# Altium footprint library Wireless Security Board.PcbLib: 38 footprints (part 1 of 3)
Each footprint in its own frame and in the unit in brackets; x right, y up, seen from the top. Pads: shape width x height; smd on the part's side, far side on the other; paste and mask are expansions set on the pad; w line width, h text height; cw(c..) or ccw(c..) is an arc to the next point about the centre after c.
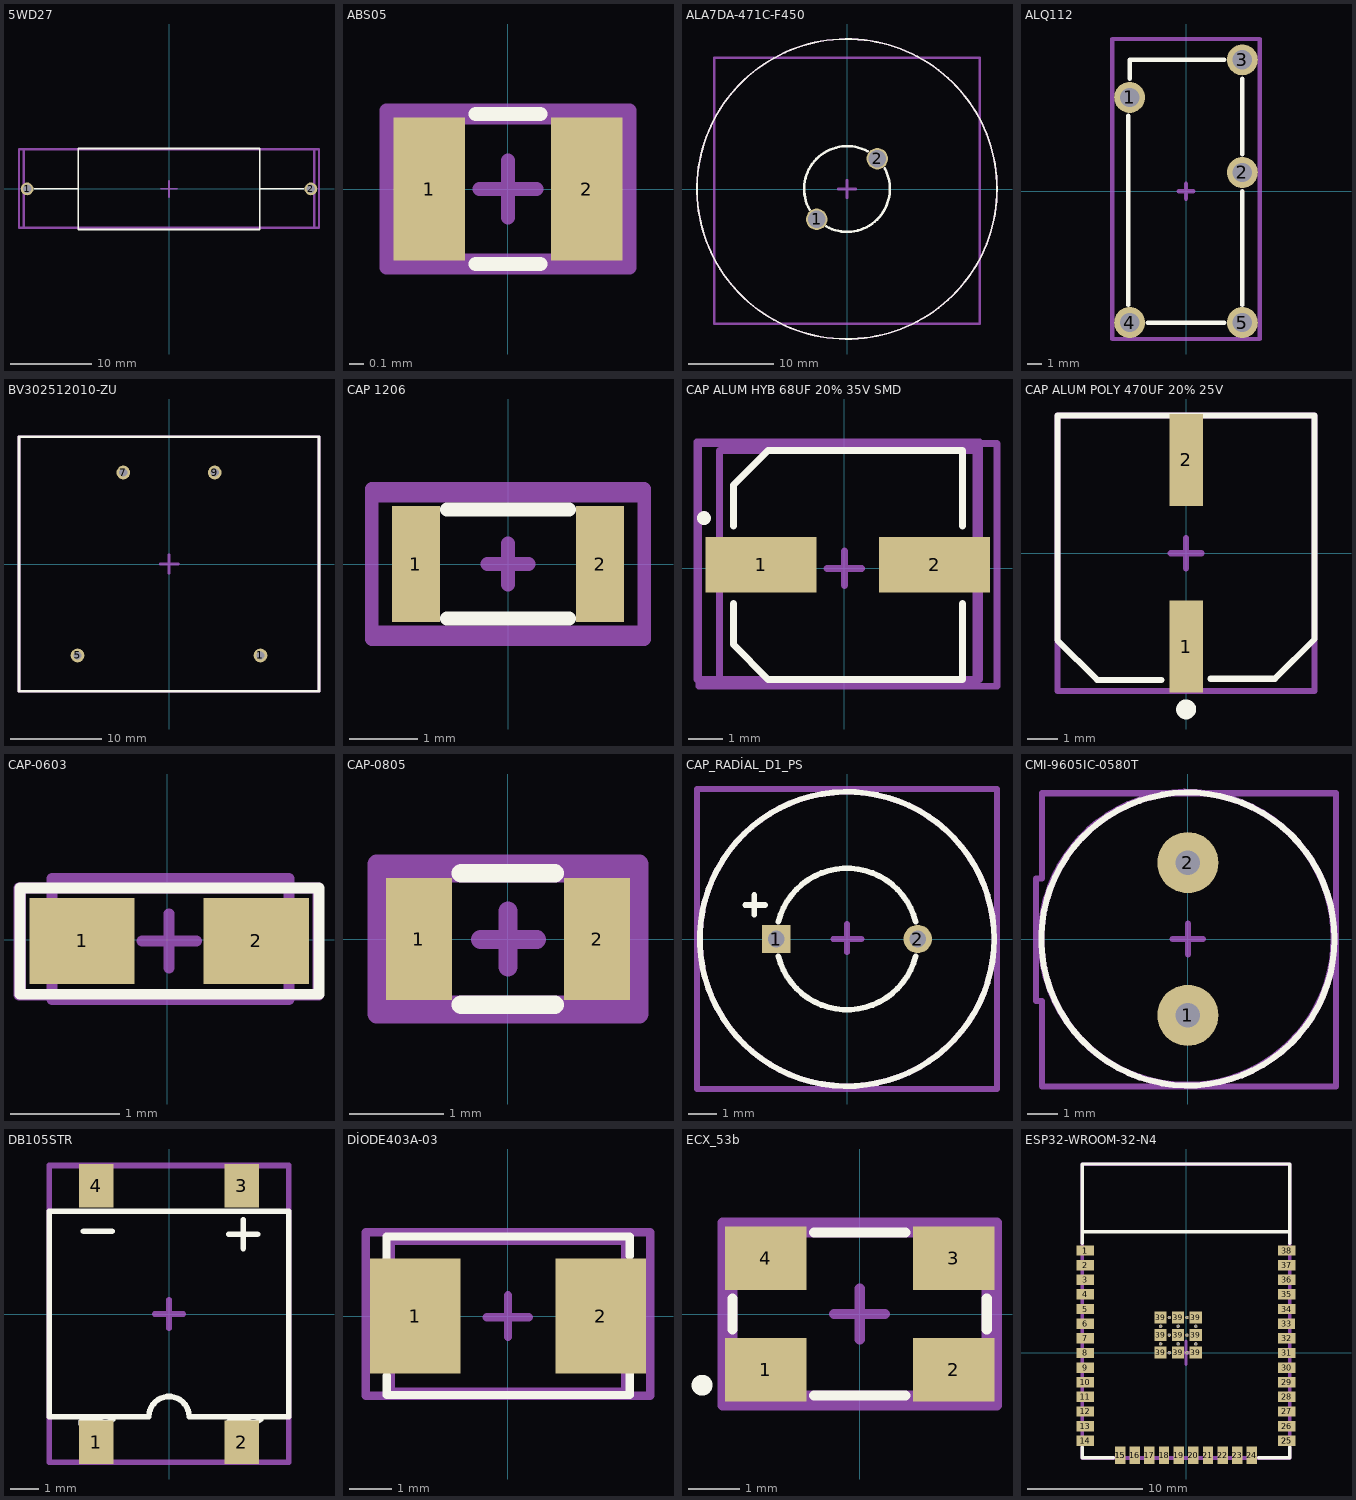
[diagram p0: the footprints below, top view; thin cyan lines are the x and y axes]

## 5WD27 [mm]
pads (2):
  round 1.575 hole 1.05: 1(-17.5,0) 2(17.5,0)
Top Overlay:
  lines w0.2: -16.6,0 -11.211,0 ; 11.211,0 16.6,0 ; -11.2,-5 -11.2,4.978 11.2,4.978 11.2,-5 -11.2,-5
Top 3D Body:
  lines w0.3: -17.9,-4.8 17.9,-4.8 17.9,4.9 -17.9,4.9 -17.9,-4.8
Top Component Center:
  lines w0.2: -1,0 1,0 ; 0,-1 0,1
  lines w0.3: -18.5,-4.8 18.5,-4.8 18.5,4.9 -18.5,4.9 -18.5,-4.8
Top Designator:
  lines w0.3: -18.5,-4.8 -18.5,4.9 18.5,4.9 18.5,-4.8 -18.5,-4.8
  text ".Designator" at -11.55,-0.917 h2.5
3D body "5WD27.step": height 9.66, standoff -6.16, extent -17.9,-4.825 17.9,4.825

## ABS05 [mm]
pads (2):
  rect 0.5x1 smd mask+0.05: 1(-0.55,0) 2(0.55,0)
Top Overlay:
  lines w0.1: -0.225,-0.525 0.225,-0.525 ; -0.225,0.525 0.225,0.525
Top 3D Body:
  lines w0.1: -0.8,-0.5 -0.8,0.5 0.8,0.5 0.8,-0.5 -0.8,-0.5
Top Component Center:
  lines w0.1: -0.2,0 0.2,0 ; 0,-0.2 0,0.2 ; -0.85,-0.55 -0.85,0.55 0.85,0.55 0.85,-0.55 -0.85,-0.55
Top Designator:
  lines w0.1: -0.85,-0.55 0.85,-0.55 0.85,0.55 -0.85,0.55 -0.85,-0.55
  text ".Designator" at -0.72,-0.145 h0.3
3D body "ABS05-32.768KHZ-T.step": height 0.5, standoff 0, extent -0.8,-0.5 0.8,0.5

## ALA7DA-471C-F450 [mm] "CAP-ALUM-470UF-450V-%20"
pads (2):
  round 2.5 hole 2 mask+0.05: 1(-3.536,-3.536) 2(3.536,3.536)
Top Overlay:
  circle w0.2: c0,0 r17.5
  lines w0.3: -4.367,-2.435 cw(c0,0) 2.388,4.393 ; -2.435,-4.367 ccw(c0,0) 4.393,2.388
Top 3D Body:
  lines w0.3: -15.5,-15.7 15.5,-15.7 15.5,15.3 -15.5,15.3 -15.5,-15.7
Top Component Center:
  circle w0.2: c0,0 r17.5
  lines w0.3: -1,0 1,0 ; 0,-1 0,1
Top Designator:
  circle w0.2: c0,0 r17.5
  text ".Designator" at -7.05,-0.417 h2.5
3D body "ala7da471cf450.stp": height 53.5, standoff -5.79, extent -15.5,-15.7 15.5,15.3

## ALQ112 [mm]
pads (5):
  round 2.1 hole 1.3 mask+0.05: 1(-3.81,6.35) 2(3.81,1.27) 3(3.81,8.89) 4(-3.81,-8.89) 5(3.81,-8.89)
Top Overlay:
  lines w0.3: -3.9,-7.7 -3.9,5.1 ; -3.8,7.6 -3.8,8.9 2.6,8.9 ; -2.6,-8.9 2.6,-8.9 ; 3.8,-7.7 3.8,0 ; 3.8,2.5 3.8,7.6
Top 3D Body:
  lines w0.3: -5,-10 -5,10.3 5,10.3 5,-10 -5,-10
Top Component Center:
  lines w0.3: -0.5,0 0.5,0 ; 0,-0.5 0,0.5 ; -5,-10 -5,10.3 5,10.3 5,-10 -5,-10
Top Designator:
  lines w0.3: -5,-10 -5,10.3 5,10.3 5,-10 -5,-10
  text ".Designator" at 0.917,9.05 h2.5
3D body: height 0, standoff -3.8, extent -4.11,6.05 -3.51,6.65
3D body: height 0, standoff -3.8, extent -4.11,-9.19 -3.51,-8.59
3D body: height 0, standoff -3.8, extent 3.51,8.59 4.11,9.19
3D body: height 0, standoff -3.8, extent 3.51,0.97 4.11,1.57
3D body: height 0, standoff -3.8, extent 3.51,-9.19 4.11,-8.59
3D body: height 16, standoff 0, extent -5,-10 5,10.27

## BV302512010-ZU [mm]
pads (4):
  round 1.5 hole 0.9 mask+0.05: 1(10,-10) 5(-10,-10) 7(-5,10) 9(5,10)
Top Overlay:
  lines w0.3: -16.4,-13.9 -16.4,13.9 16.4,13.9 16.4,-13.9 -16.4,-13.9
Top 3D Body:
  lines w0.3: -16.4,-13.9 -16.4,13.9 16.4,13.9 16.4,-13.9 -16.4,-13.9
Top Component Center:
  lines w0.3: -0.96,-0.004 1.04,-0.004 ; 0,-1 0,1 ; -16.4,-13.9 16.4,-13.9 16.4,13.9 -16.4,13.9 -16.4,-13.9
Top Designator:
  lines w0.3: -16.4,-13.9 -16.4,13.9 16.4,13.9 16.4,-13.9 -16.4,-13.9
  text ".Designator" at -7.8,-0.667 h2.5
3D body "ZETTLER BV301 BV302 1.0VA v2.iges": height 22.9, standoff -4.9, extent -16.4,-13.9 16.4,13.9

## CAP 1206 [mm]
pads (2):
  rect 0.7x1.7 smd mask+0.05: 1(-1.35,0) 2(1.35,0)
Top Overlay:
  lines w0.2: -0.9,-0.8 0.9,-0.8 ; -0.9,0.8 0.9,0.8
Top 3D Body:
  lines w0.2: -2,-1 2,-1 2,1 -2,1 -2,-1
Top Component Center:
  lines w0.2: -0.3,0 0.3,0 ; 0,-0.3 0,0.3 ; -2,-1.1 2,-1.1 2,1.1 -2,1.1 -2,-1.1
Top Designator:
  lines w0.2: -2,-1.1 -2,1.1 2,1.1 2,-1.1 -2,-1.1
  text ".Designator" at -1.3,-0.267 h0.7
3D body "CAPC1206.STEP": height 1.3, standoff -0.01, extent -1.975,-0.976 1.975,0.976

## CAP ALUM HYB 68UF 20% 35V SMD [mm] "EEH-ZA1V680XP"
pads (2):
  rect 3.2x1.6 smd: 1(-2.4,0.1) 2(2.6,0.1)
Top Overlay:
  circle w0.2: c-4.05,1.45 r0.1
  lines w0.2: -3.2,-1.02 -3.2,-2.2 -2.2,-3.2 3.4,-3.2 3.4,-1.02 ; -3.2,1.22 -3.2,2.4 -2.2,3.4 3.4,3.4 3.4,1.22
Top 3D Body:
  circle w0.2: c-4.05,1.45 r0.1
  lines w0.2: -3.6,-3.2 -3.6,3.4 3.8,3.4 3.8,-3.2 -3.6,-3.2
Top Component Center:
  lines w0.2: -0.5,0 0.5,0 ; 0,-0.5 0,0.5 ; -4.2,-3.4 -4.2,3.6 4.4,3.6 4.4,-3.4 -4.2,-3.4
Top Designator:
  lines w0.2: -4.25,-3.2 3.9,-3.2 3.9,3.65 -4.25,3.65 -4.25,1.15 -4.25,-0.95 -4.25,-3.2
  text ".Designator" at -3.9,-0.4 h1.5
3D body "step_temp.STEP": height 7.7, standoff 0, extent -3.55,-3.2 3.75,3.4

## CAP ALUM POLY 470UF 20% 25V [mm] "PCR1E471MCL1GS"
pads (2):
  rect 1.1x3 smd mask+0.05: 1(0,-3.05) 2(0,3.05)
Top Overlay:
  circle w0.35: c0,-5.1 r0.15
  lines w0.2: -0.806,-4.136 -2.906,-4.136 -4.206,-2.836 -4.206,4.5 4.2,4.5 4.2,-2.8 2.9,-4.1 0.8,-4.1
Top 3D Body:
  lines w0.2: -4.2,-4.5 4.2,-4.5 4.2,4.5 -4.2,4.5 -4.2,-4.5
Top Component Center:
  lines w0.2: -0.5,0 0.5,0 ; 0,-0.5 0,0.5 ; -4.2,-4.5 4.2,-4.5 4.2,4.5 -4.2,4.5 -4.2,-4.5
Top Designator:
  lines w0.2: -4.2,-4.5 4.2,-4.5 4.2,4.5 -4.2,4.5 -4.2,-4.5
  text ".Designator" at -3.55,-0.484 h1.7
3D body "PCR1E221MCL6GS.STEP": height 10.8, standoff 0, extent -4.15,-4.45 4.15,4.45

## CAP-0603 [mil]
pads (2):
  rect 38x31 smd mask+1.97: 1(-30.8,-0.5) 2(32.2,-0.5)
Top Overlay:
  lines w3.94: -53.2,-19.8 -53.2,18.7 54.9,18.7 54.9,-19.8 -53.2,-19.8
Top 3D Body:
  lines w3.94: -41.7,-21.7 -41.7,22.1 44,22.1 44,-21.7 -41.7,-21.7
Top Component Center:
  lines w3.94: -9.14,-0.5 10.54,-0.5 ; 0.7,-10.34 0.7,9.34 ; -53,-19.8 -53,18.7 54.5,18.7 54.5,-19.8 -53,-19.8
Top Designator:
  lines w3.94: -53.6,-20 54.8,-20 54.8,18.7 -53.6,18.7 -53.6,-20
  text ".Designator" at -27.06,-7.4 h19.68
3D body "CAPC0603.STEP": height 31.5, standoff 0, extent -39.94,-20.23 42.77,20.27

## CAP-0805 [mm]
pads (2):
  rect 0.7x1.3 smd mask+0.05: 1(-0.95,0) 2(0.95,0)
Top Overlay:
  lines w0.2: -0.5,-0.7 0.5,-0.7 ; -0.5,0.7 0.5,0.7
Top 3D Body:
  lines w0.2: -1.3,-0.7 -1.3,0.7 1.3,0.7 1.3,-0.7 -1.3,-0.7
Top Component Center:
  lines w0.2: -0.293,-0.006 0.307,-0.006 ; 0,-0.3 0,0.3 ; -1.4,-0.8 -1.4,0.8 1.4,0.8 1.4,-0.8 -1.4,-0.8
Top Designator:
  lines w0.2: -1.4,-0.8 -1.4,0.8 1.4,0.8 1.4,-0.8 -1.4,-0.8
  text ".Designator" at -1.1,-0.233 h0.5
3D body "CAPC0805.STEP": height 0.9, standoff 0, extent -1.301,-0.678 1.301,0.678

## CAP_RADİAL_D1_PS [mm]
pads (2):
  rect 1x1 hole 0.6 mask+0.05: 1(-2.5,0)
  round 1 hole 0.6 mask+0.05: 2(2.5,0)
Top Overlay:
  circle w0.2: c0,0 r5.2
  lines w0.2: -3.6,1.2 -2.9,1.2 ; -3.271,0.852 -3.271,1.552 ; -2.425,-0.606 ccw(c0,0) 2.425,-0.606 ; -2.425,0.606 cw(c0,0) 2.425,0.606
Top 3D Body:
  lines w0.2: -5.3,-5.3 5.3,-5.3 5.3,5.3 -5.3,5.3 -5.3,-5.3
Top Component Center:
  circle w0.2: c0,0 r5.2
  lines w0.2: -0.489,0 0.511,0 ; 0,-0.47 0,0.53
Top Designator:
  circle w0.2: c0,0 r5.2
  text ".Designator" at -3.75,-0.25 h1.5
3D body "CAP_ESH_H4_KEM.step": height 22.11, standoff -4.27, extent -5.269,-5.242 5.245,5.242

## CMI-9605IC-0580T [mm] "BUZZER-MAGNETIC-5V"
pads (2):
  round 2 hole 0.8 mask+0.05: 1(0,-2.5) 2(0,2.5)
Top Overlay:
  circle w0.2: c0,0 r4.8
Top 3D Body:
  lines w0.2: -4.975,-2.025 -4.975,1.975 -4.775,1.975 -4.775,4.775 4.85,4.775 4.85,-4.825 -4.775,-4.825 -4.775,-2.025 -4.975,-2.025
Top Component Center:
  circle w0.2: c0,0 r4.8
  lines w0.2: -0.5,0 0.5,0 ; 0,-0.5 0,0.5
Top Designator:
  circle w0.2: c-0.025,0.025 r4.8
  text ".Designator" at -2.121,-0.738 h1.52
3D body: height 5.2, standoff 0.2, extent -4.767,-4.826 4.833,4.774
3D body: height 0.15, standoff -5.35, extent -0.275,2.175 0.325,2.775
3D body: height 0.15, standoff -3.85, extent -0.275,-2.825 0.325,-2.225
3D body: height 5.3, standoff 5.2, extent -3.775,-3.825 3.825,3.775
3D body: height 5.3, standoff 5.2, extent -4.975,-2.025 -0.975,1.975

## DB105STR [mm] "BRIDGE-RECT-DBS-1PHASE-600V-1A"
pads (4):
  rect 1.2x1.52 smd: 1(-2.55,-4.5) 2(2.55,-4.5) 3(2.55,4.5) 4(-2.55,4.5)
Top Overlay:
  lines w0.2: -3,2.9 -2,2.9 ; 2.1,2.8 3.1,2.8 ; 2.6,2.3 2.6,3.3 ; -4.2,-3.6 -0.707,-3.6 cw(c0,-3.6) 0.707,-3.6 4.2,-3.6 4.2,3.6 -4.2,3.6 -4.2,-3.6
  text "~" at -3.4,-4.4 h1.52
  text "~" at 1.8,-4.4 h1.52
Top 3D Body:
  lines w0.2: -4.2,-5.2 4.2,-5.2 4.2,5.2 -4.2,5.2 -4.2,-5.2
Top Component Center:
  lines w0.2: -4.2,5.2 -4.2,-5.2 4.2,-5.2 4.2,5.218 -4.2,5.218 ; -0.5,0 0.5,0 ; 0,-0.5 0,0.5
Top Designator:
  lines w0.2: -4.2,-5.2 4.2,-5.2 4.2,5.2 -4.2,5.2 -4.2,-5.2
  text ".Designator" at -2.346,-0.638 h1.52
3D body "DB107S  DB-S.step": height 2.66, standoff 0, extent -4.16,-5.176 4.16,5.224

## DİODE403A-03 [mm]
pads (2):
  rect 2.159x2.743 smd mask+0.05: 1(-2.21,0) 2(2.21,0)
Top Overlay:
  lines w0.2: -2.9,1.4 -2.9,1.9 2.904,1.9 2.904,1.442 ; -2.896,-1.425 -2.896,-1.883 2.908,-1.883 2.908,-1.383
Top 3D Body:
  lines w0.2: -2.8,-1.8 2.8,-1.8 2.8,1.8 -2.8,1.8 -2.8,-1.8
Top Component Center:
  lines w0.2: -0.504,-0.029 0.496,-0.029 ; 0,-0.5 0,0.5 ; -3.4,-1.9 -3.4,2 3.4,2 3.4,-1.9 -3.4,-1.9
Top Designator:
  lines w0.2: -3.4,-1.9 -3.4,2 3.4,2 3.4,-1.9 -3.4,-1.9
  text ".Designator" at -2.45,-0.417 h1
3D body "User Library-403A-03_rotated.STEP": height 2.31, standoff 0, extent -2.72,-1.78 2.72,1.78

## ECX_53b [mm]
pads (4):
  rect 1.6x1.25 smd mask+0.05: 1(-1.85,-1.1) 2(1.85,-1.1) 3(1.85,1.1) 4(-1.85,1.1)
Top Overlay:
  circle w0.21: c-3.1,-1.4 r0.1
  lines w0.2: -2.5,-0.3 -2.5,0.3 ; -0.9,-1.6 0.9,-1.6 ; -0.9,1.6 0.9,1.6 ; 2.5,-0.3 2.5,0.3
Top 3D Body:
  lines w0.2: -2.5,-1.6 -2.5,1.6 2.5,1.6 2.5,-1.6 -2.5,-1.6
Top Component Center:
  lines w0.2: -0.5,0 0.5,0 ; 0,-0.5 0,0.5 ; -2.7,-1.8 -2.7,1.8 2.7,1.8 2.7,-1.8 -2.7,-1.8
Top Designator:
  lines w0.2: -2.7,-1.8 -2.7,1.8 2.7,1.8 2.7,-1.8 -2.7,-1.8
  text ".Designator" at -2,-0.467 h1
3D body "ECS-160-20-30B-TR.step": height 0.85, standoff 0, extent -2.5,-1.6 2.5,1.6

## ESP32­WROOM­32-N4 [mm]
pads (62):
  rect 1.5x0.9 smd mask+0.05: 1(-8.75,8.89) 1(-8.75,8.89) 2(-8.75,7.62) 3(-8.75,6.35) 4(-8.75,5.08) 5(-8.75,3.81) 6(-8.75,2.54) 7(-8.75,1.27) 8(-8.75,0) 9(-8.75,-1.27) 10(-8.75,-2.54) 11(-8.75,-3.81) 12(-8.75,-5.08) 13(-8.75,-6.35) 14(-8.75,-7.62) 25(8.75,-7.62) 25(8.75,-7.62) 26(8.75,-6.35) 27(8.75,-5.08) 28(8.75,-3.81) 29(8.75,-2.54) 30(8.75,-1.27) 31(8.75,0) 32(8.75,1.27) 33(8.73,2.535) 34(8.75,3.81) 35(8.75,5.08) 36(8.75,6.35) 37(8.75,7.62) 38(8.75,8.89)
  rect 0.9x1.5 smd mask+0.05: 15(-5.715,-8.87) 15(-5.715,-8.87) 16(-4.445,-8.87) 17(-3.175,-8.87) 18(-1.905,-8.87) 19(-0.635,-8.87) 20(0.635,-8.87) 21(1.905,-8.87) 22(3.175,-8.87) 23(4.445,-8.87) 24(5.715,-8.89)
  rect 1.05x1.05 smd mask+0.05: 39(-2.206,0.024) 39(-2.206,1.55) 39(-2.206,3.076) 39(-0.68,0.024) 39(-0.68,1.55) 39(-0.68,3.076) 39(0.846,0.024) 39(0.846,1.55) 39(0.846,3.076)
  round 0.3 hole 0.2 mask+0.05: 40(-2.206,0.787) 40(-2.206,2.313) 40(-1.443,0.024) 40(-1.443,1.55) 40(-1.443,3.076) 40(-0.68,0.787) 40(-0.68,2.313) 40(0.083,0.024) 40(0.083,1.55) 40(0.083,3.076) 40(0.846,0.787) 40(0.846,2.313)
Top Overlay:
  lines w0.3: -9,-8.2 -9,-9.1 -6.3,-9.1 ; -9,9.5 -9,16.4 9,16.4 9,9.5 ; -9,10.5 9,10.5 ; 6.3,-9.1 9,-9.1 9,-8.2
Top 3D Body:
  lines w0.3: 8.98,16.375 -8.99,16.375 -8.99,-9.1 9.02,-9.1 9.02,16.375
Top Component Center:
  lines w0.3: -0.986,0 1.014,0 ; 0,-1 0,1 ; -9,-9.125 -9,16.375 9.025,16.375 9.025,-9.125 -9,-9.125
Top Designator:
  lines w0.3: 9.005,16.38 9.005,-9.115 -8.99,-9.115 -8.99,16.395 9.005,16.395
  text ".Designator" at -2.251,-0.493 h1.52
3D body "ESP32-WROOM-32-N4--3DModel-STEP-56544.STEP": height 3.35, standoff 0.1, extent -9,-9.1 9,16.4